# Altium integrated library ESC_control.IntLib: 17 symbols
Pins are listed as number, name and electrical type; pins without a type are passive.

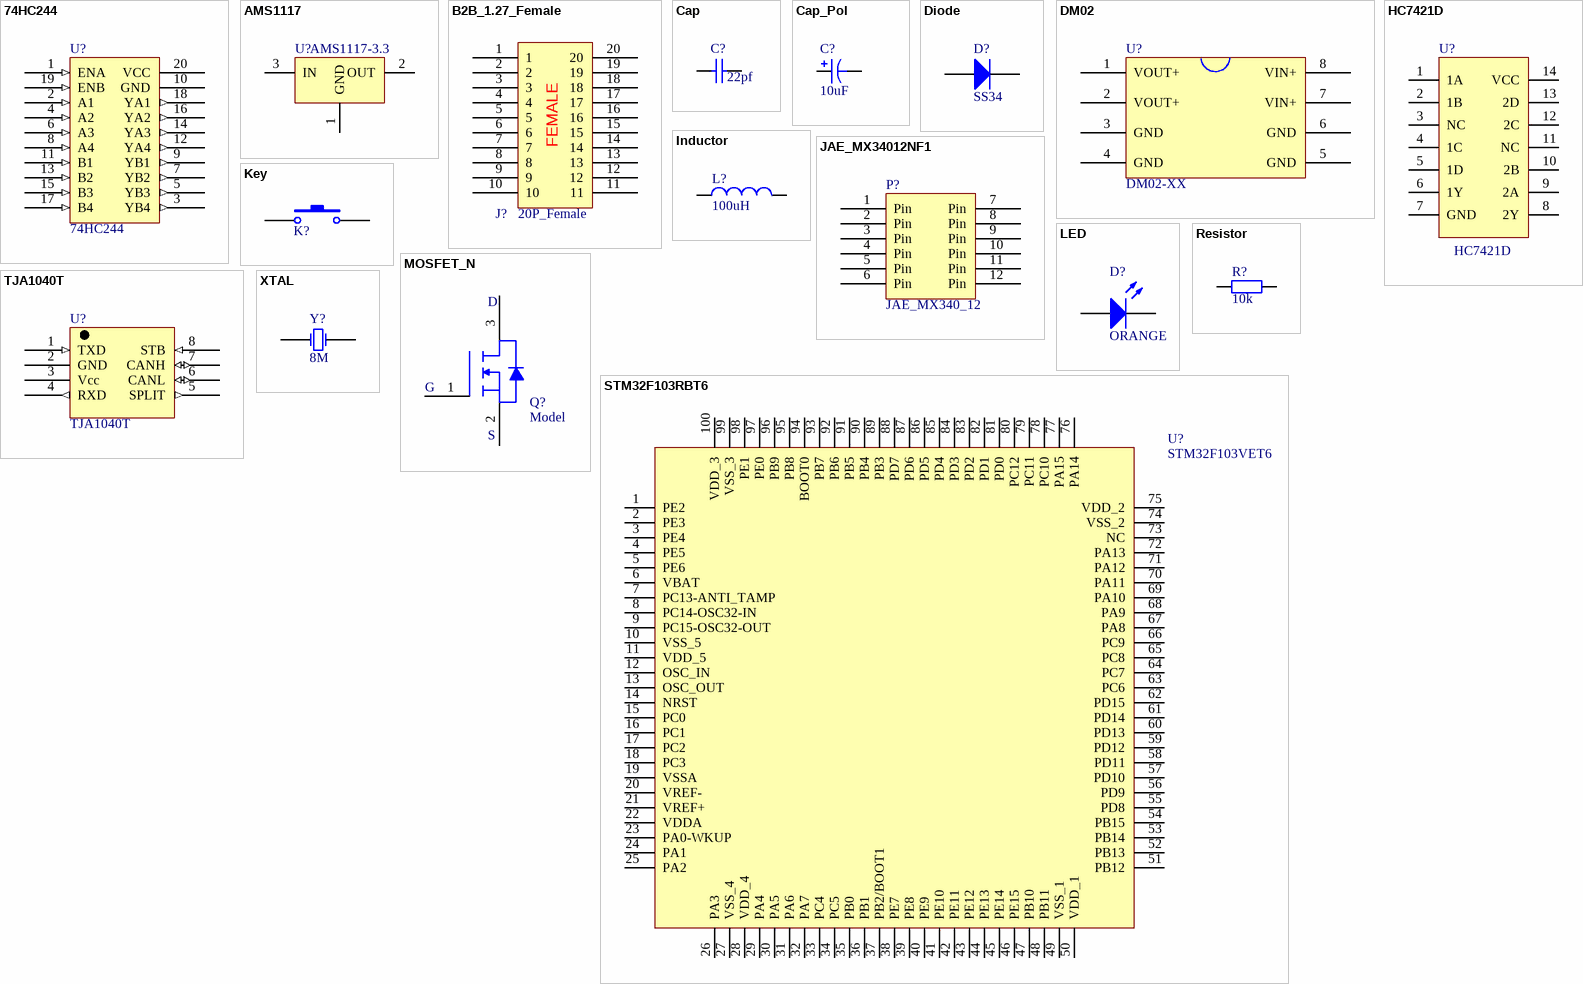
[diagram p0: symbols 74HC244 to XTAL]

## 74HC244
designator U?
CMOS工艺8通道缓冲器
footprint SSOP20
footprint SOP20
pins: 1 ENA (in), 2 A1 (in), 3 YB4 (out), 4 A2 (in), 5 YB3 (out), 6 A3 (in), 7 YB2 (out), 8 A4 (in), 9 YB1 (out), 10 GND (power), 11 B1 (in), 12 YA4 (out), 13 B2 (in), 14 YA3 (out), 15 B3 (in), 16 YA2 (out), 17 B4 (in), 18 YA1 (out), 19 ENB (in), 20 VCC (power)

## AMS1117
designator U?, comment AMS1117-3.3
线性稳压器
footprint SOT223
pins: 1 GND (power), 2 OUT (power), 3 IN (power)

## B2B_1.27_Female
designator J?, comment 20P_Female
板对板连接器 母头
footprint B2B_1.27_Female
pins: 1, 2, 3, 4, 5, 6, 7, 8, 9, 10, 11, 12, 13, 14, 15, 16, 17, 18, 19, 20
text: FEMALE

## Cap
designator C?, comment 22pf
无极性电容
footprint C 0805
footprint C 0603
footprint C 1206
pins: 1, 2

## Cap_Pol
designator C?, comment 10uF
极性电容
footprint CP 6.3*5.5
footprint CP 8*6.2
footprint CP 3528B
pins: 1, 2

## Diode
designator D?, comment SS34
二极管
footprint DO-214
footprint LL34
pins: 1 A, 2 K

## DM02
designator U?, comment DM02-XX
开关型DC-DC变换器
footprint DM02
pins: 1 VOUT+, 2 VOUT+, 3 GND, 4 GND, 5 GND, 6 GND, 7 VIN+, 8 VIN+

## HC7421D
designator U?
footprint 74hc74 (14脚)
pins: 1 1A, 2 1B, 3 NC, 4 1C, 5 1D, 6 1Y, 7 GND, 8 2Y, 9 2A, 10 2B, 11 NC, 12 2C, 13 2D, 14 VCC

## Inductor
designator L?, comment 100uH
电感
footprint L 0603
footprint L 0805
footprint L 1206
pins: 1, 2

## JAE_MX34012NF1
designator P?, comment JAE_MX340_12
footprint JAE_MX34_2.2_12
pins: 1 Pin, 2 Pin, 3 Pin, 4 Pin, 5 Pin, 6 Pin, 7 Pin, 8 Pin, 9 Pin, 10 Pin, 11 Pin, 12 Pin

## Key
designator K?  (value not drawn)
按键
footprint KEY 3.6*2.5 SMD
pins: 1, 2

## LED
designator D?, comment ORANGE
发光二极管
footprint LED-3mm
footprint LED-5mm
footprint LED_0805
footprint LED_1206
footprint LED_5050
footprint LED_0603
pins: 1 A, 2 K

## MOSFET_N
designator Q?, comment Model
N沟道MOS管
footprint SOT23-3
footprint TO252
pins: 1 G, 2, 3
text: D; S

## Resistor
designator R?, comment 10k
电阻
footprint R 0603
footprint R 0805
footprint R 1206
footprint R 2512
pins: 1, 2

## STM32F103RBT6
designator U?, comment STM32F103VET6
Published: 20110607
footprint TQFP100N50P14X14X1.2 (TQFP, 100-Leads, Body 16.0x16.0mm (max), Pitch 0.50mm, IPC Medium Density)
pins: 1 PE2, 2 PE3, 3 PE4, 4 PE5, 5 PE6, 6 VBAT, 7 PC13-ANTI_TAMP, 8 PC14-OSC32-IN, 9 PC15-OSC32-OUT, 10 VSS_5, 11 VDD_5, 12 OSC_IN, 13 OSC_OUT, 14 NRST, 15 PC0, 16 PC1, 17 PC2, 18 PC3, 19 VSSA, 20 VREF-, 21 VREF+, 22 VDDA, 23 PA0-WKUP, 24 PA1, 25 PA2, 26 PA3, 27 VSS_4, 28 VDD_4, 29 PA4, 30 PA5, 31 PA6, 32 PA7, 33 PC4, 34 PC5, 35 PB0, 36 PB1, 37 PB2/BOOT1, 38 PE7, 39 PE8, 40 PE9, 41 PE10, 42 PE11, 43 PE12, 44 PE13, 45 PE14, 46 PE15, 47 PB10, 48 PB11, 49 VSS_1, 50 VDD_1, 51 PB12, 52 PB13, 53 PB14, 54 PB15, 55 PD8, 56 PD9, 57 PD10, 58 PD11, 59 PD12, 60 PD13, 61 PD14, 62 PD15, 63 PC6, 64 PC7, 65 PC8, 66 PC9, 67 PA8, 68 PA9, 69 PA10, 70 PA11, 71 PA12, 72 PA13, 73 NC, 74 VSS_2, 75 VDD_2, 76 PA14, 77 PA15, 78 PC10, 79 PC11, 80 PC12, 81 PD0, 82 PD1, 83 PD2, 84 PD3, 85 PD4, 86 PD5, 87 PD6, 88 PD7, 89 PB3, 90 PB4, 91 PB5, 92 PB6, 93 PB7, 94 BOOT0, 95 PB8, 96 PB9, 97 PE0, 98 PE1, 99 VSS_3, 100 VDD_3

## TJA1040T
designator U?
高速CAN收发器
footprint SOP8
pins: 1 TXD (in), 2 GND, 3 Vcc, 4 RXD (out), 5 SPLIT (out), 6 CANL (io), 7 CANH (io), 8 STB (in)

## XTAL
designator Y?, comment 8M
晶振
footprint XTAL-49S SMD
footprint XTAL-5032
pins: 1 OSC1, 2 OSC2